# Altium footprint library 常用元件封装库.PcbLib: 1310 footprints (part 48 of 83)
Each footprint in its own frame and in the unit in brackets; x right, y up, seen from the top. Pads: shape width x height; smd on the part's side, far side on the other; paste and mask are expansions set on the pad; w line width, h text height; cw(c..) or ccw(c..) is an arc to the next point about the centre after c.
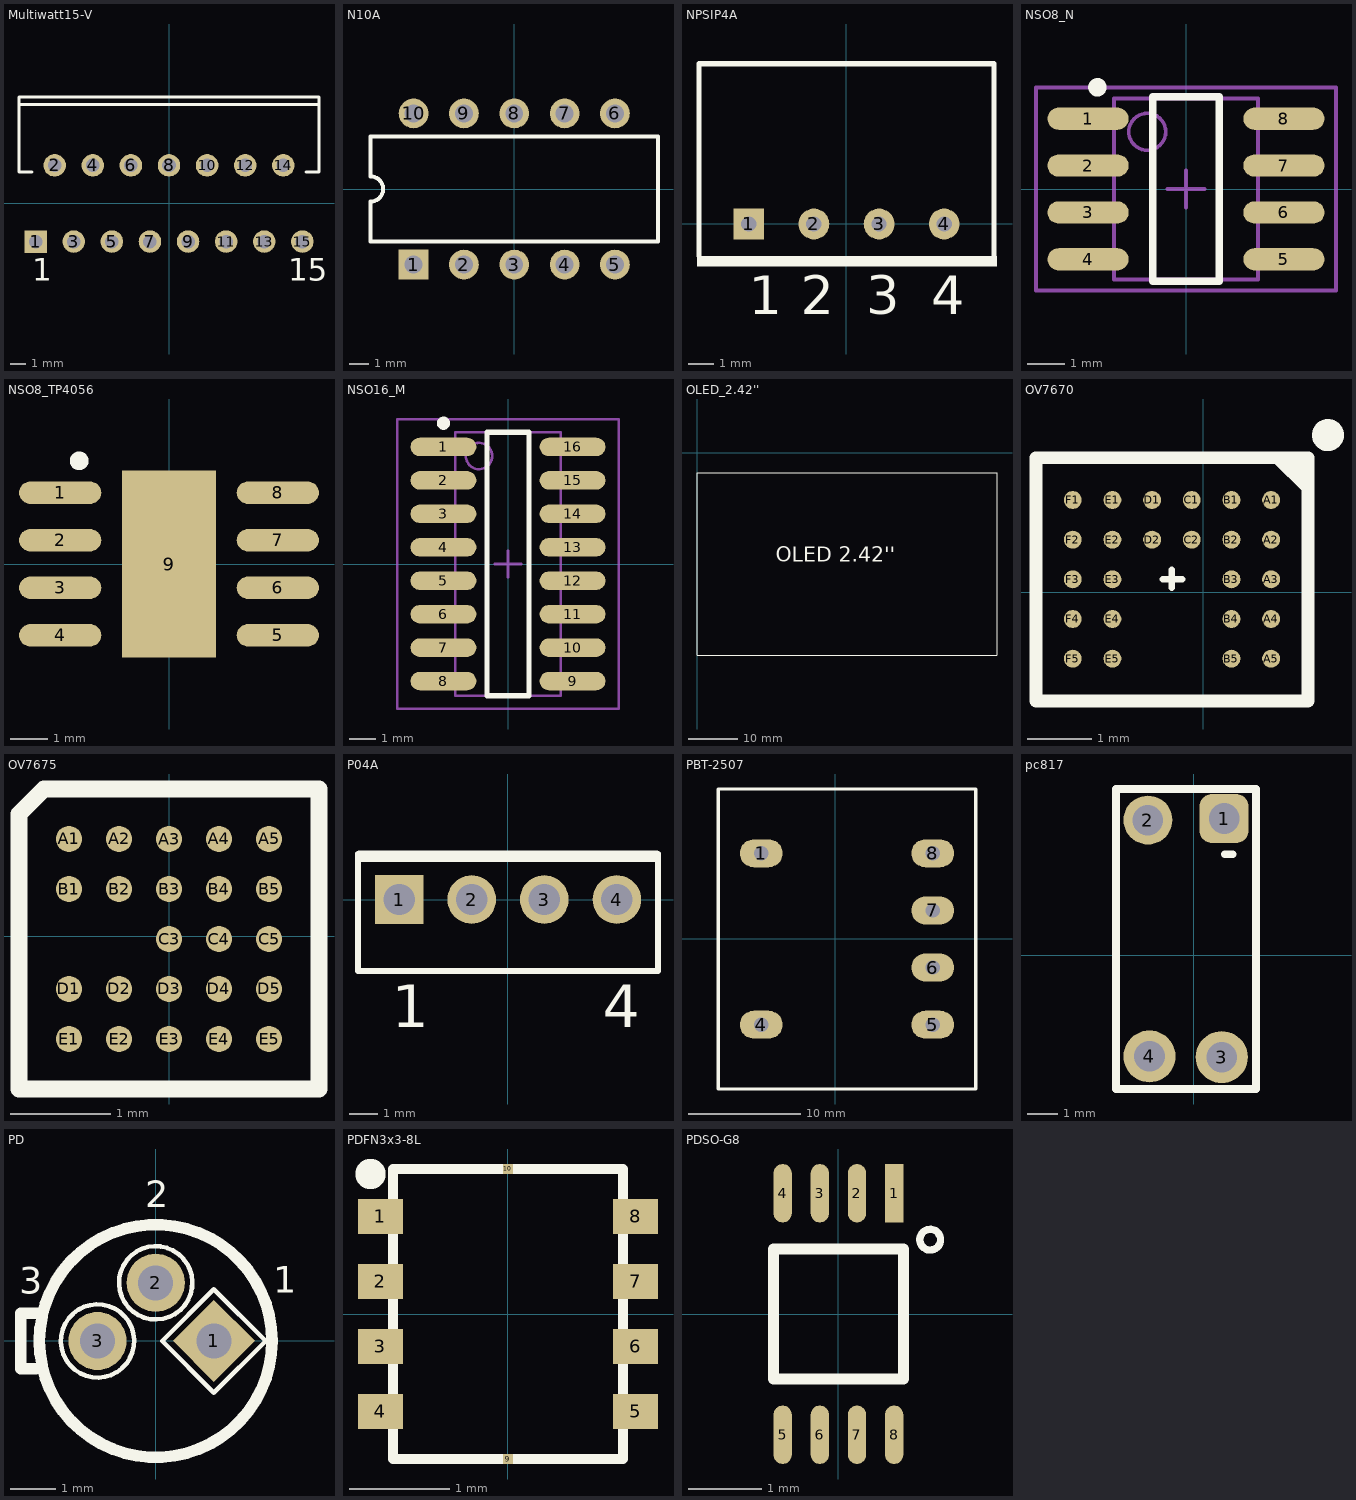
[diagram p47: the footprints below, top view; thin cyan lines are the x and y axes]

## Multiwatt15-V [mm]
height 21
pads (15):
  rect 1.5x1.5 hole 0.9: 1(-8.89,-2.54)
  round 1.5 hole 0.9: 2(-7.62,2.54) 3(-6.35,-2.54) 4(-5.08,2.54) 5(-3.81,-2.54) 6(-2.54,2.54) 7(-1.27,-2.54) 8(0,2.54) 9(1.27,-2.54) 10(2.54,2.54) 11(3.81,-2.54) 12(5.08,2.54) 13(6.35,-2.54) 14(7.62,2.54) 15(8.89,-2.54)
Top Overlay:
  lines w0.2: -10,6.59 10,6.59 ; -9.144,2.09 -10,2.09 -10,7.09 10,7.09 10,2.09 9.144,2.09
  text "1" at -9.12,-5.165 h1.5
  text "15" at 7.94,-5.165 h1.5

## N10A [mm] "DIP; 10 Leads; Row Spacing 7.62 mm; Pitch 2.54 mm"
height 5.08
pads (10):
  rect 1.5x1.5 hole 0.9: 1(-5.08,-3.81)
  round 1.5 hole 0.9: 2(-2.54,-3.81) 3(0,-3.81) 4(2.54,-3.81) 5(5.08,-3.81) 6(5.08,3.81) 7(2.54,3.81) 8(0,3.81) 9(-2.54,3.81) 10(-5.08,3.81)
Top Overlay:
  lines w0.2: -7.25,-2.65 7.25,-2.65 7.25,2.65 -7.25,2.65 -7.25,0.635 cw(c-7.25,0) -7.25,-0.635 -7.25,-2.65

## NPSIP4A [mm] "SIP; 4 Leads; Body 10 x 11.5 x 7.5 mm (typ); Pitch 2.54 mm"
height 10.6
pads (4):
  rect 1.2x1.2 hole 0.6: 1(-3.81,0)
  round 1.2 hole 0.6: 2(-1.27,0) 3(1.27,0) 4(3.81,0)
Top Overlay:
  rectangle: -5.83,-1.65 5.87,-1.25
  lines w0.2: -5.75,-1.25 -5.75,6.25 5.75,6.25 5.75,-1.25
  text "4" at 3.302,-3.52 h1.5
  text "3" at 0.762,-3.52 h1.5
  text "2" at -1.778,-3.52 h1.5
  text "1" at -3.81,-3.52 h1.5

## NSO8_N [mm] "SOIC-max660"
height 1.75
pads (8):
  oval 2.2x0.6 smd: 1(-2.654,1.905) 2(-2.654,0.635) 3(-2.654,-0.635) 4(-2.654,-1.905) 5(2.654,-1.905) 6(2.654,-0.635) 7(2.654,0.635) 8(2.654,1.905)
Top Overlay:
  circle w0.25: c-2.4,2.755 r0.125
  lines w0.2: -0.9,-2.5 -0.9,2.5 0.9,2.5 0.9,-2.5 -0.9,-2.5
Mechanical 13:
  circle w0.1: c-1.05,1.55 r0.5
  lines w0.1: -1.95,-2.45 -1.95,2.45 1.95,2.45 1.95,-2.45 -1.95,-2.45
Mechanical 15:
  lines w0.1: -0.5,0 0.5,0 ; 0,-0.5 0,0.5 ; -4.064,-2.75 -4.064,2.75 4.064,2.75 4.064,-2.75 -4.064,-2.75
3D body: height 1.75, standoff 0, extent -1.95,-2.45 1.95,2.45

## NSO8_TP4056 [mm] "SOIC-max660"
height 1.75
pads (9):
  oval 2.2x0.6 smd: 1(-2.908,1.905) 2(-2.908,0.635) 3(-2.908,-0.635) 4(-2.908,-1.905) 5(2.908,-1.905) 6(2.908,-0.635) 7(2.908,0.635) 8(2.908,1.905)
  rect 2.5x5 smd: 9(0,0)
Top Overlay:
  circle w0.25: c-2.4,2.755 r0.125

## NSO16_M [mm] "SOIC, 16-Leads, Body 9.9x3.9mm, Pitch 1.27mm, IPC Low Density"
height 1.75
pads (16):
  oval 2.5x0.7 smd: 1(-2.45,4.445) 2(-2.45,3.175) 3(-2.45,1.905) 4(-2.45,0.635) 5(-2.45,-0.635) 6(-2.45,-1.905) 7(-2.45,-3.175) 8(-2.45,-4.445) 9(2.45,-4.445) 10(2.45,-3.175) 11(2.45,-1.905) 12(2.45,-0.635) 13(2.45,0.635) 14(2.45,1.905) 15(2.45,3.175) 16(2.45,4.445)
Top Overlay:
  circle w0.25: c-2.45,5.345 r0.125
  lines w0.2: -0.8,-5 0.8,-5 0.8,5 -0.8,5 -0.8,-5
Mechanical 13:
  circle w0.1: c-1.1,4.1 r0.5
  lines w0.1: -2,-5 2,-5 2,5 -2,5 -2,-5
Mechanical 15:
  lines w0.1: -0.5,0 0.5,0 ; 0,-0.5 0,0.5 ; -4.2,-5.5 4.2,-5.5 4.2,5.5 -4.2,5.5 -4.2,-5.5
3D body: height 1.75, standoff 0, extent -2,-5 2,5

## OLED_2.42'' [mil]
Top Overlay:
  lines w6: 0,-1620 2400,-1620 2401.57,-1618.43 2401.57,-160 0,-160 0,-1620
  text "OLED 2.42''" at 630,-870 h120
3D body "User Library-DD-12864YW-6K.STEP": height 92.56, standoff 5.94, extent 9.05,-1618.35 2390.94,-4.17

## OV7670 [mm]
pads (24):
  round 0.28 smd: A1(1.062,1.44) A2(1.062,0.82) A3(1.062,0.2) A4(1.062,-0.42) A5(1.062,-1.04) B1(0.442,1.44) B2(0.442,0.82) B3(0.442,0.2) B4(0.442,-0.42) B5(0.442,-1.04) C1(-0.178,1.44) C2(-0.178,0.82) D1(-0.798,1.44) D2(-0.798,0.82) E1(-1.418,1.44) E2(-1.418,0.82) E3(-1.418,0.2) E4(-1.418,-0.42) E5(-1.418,-1.04) F1(-2.038,1.44) F2(-2.038,0.82) F3(-2.038,0.2) F4(-2.038,-0.42) F5(-2.038,-1.04)
Top Overlay:
  circle w0.25: c1.951,2.454 r0.125
  region: 1.637,1.628 1.165,2.1 1.637,2.1
  lines w0.102: -0.632,0.2 -0.327,0.2 ; -0.488,0.068 -0.488,0.347
  lines w0.2: 1.165,2.1 1.637,1.628 ; -2.613,-1.7 1.637,-1.7 1.637,2.1 -2.613,2.1 -2.613,-1.7

## OV7675 [mm]
height 1.45
pads (23):
  round 0.26 smd: A1(-1,0.973) A2(-0.5,0.973) A3(0,0.973) A4(0.5,0.973) A5(1,0.973) B1(-1,0.473) B2(-0.5,0.473) B3(0,0.473) B4(0.5,0.473) B5(1,0.473) C3(0,-0.027) C4(0.5,-0.027) C5(1,-0.027) D1(-1,-0.527) D2(-0.5,-0.527) D3(0,-0.527) D4(0.5,-0.527) D5(1,-0.527) E1(-1,-1.027) E2(-0.5,-1.027) E3(0,-1.027) E4(0.5,-1.027) E5(1,-1.027)
Top Overlay:
  lines w0.17: -1.5,-1.527 -1.5,1.223 -1.25,1.473 1.5,1.473 1.5,-1.527 -1.5,-1.527

## P04A [mm] "TO, Thru-Hole, Vertical, Heatsink Mounted; 4 In-Line Leads; Pitch 2.54 mm"
height 20.6
pads (4):
  rect 1.7x1.7 hole 1.1: 1(-3.81,0)
  round 1.7 hole 1.1: 2(-1.27,0) 3(1.27,0) 4(3.81,0)
Top Overlay:
  rectangle: -5.25,1.311 5.25,1.711
  lines w0.2: -5.25,1.6 -5.25,-2.5 5.25,-2.5 5.25,1.6
  text "4" at 3.31,-4.475 h1.5
  text "1" at -4.06,-4.475 h1.5

## PBT-2507 [mil]
pads (6):
  oval 150x98 hole 50: 1(-259,299) 4(-259,-301) 5(341,-301) 6(341,-101) 7(341,99) 8(341,299)
Top Overlay:
  lines w12: -409,-526 -409,524 491,524 491,-526 -409,-526

## pc817 [mm]
pads (4):
  rrect50% 1.6x1.6 hole 1: 1(0.991,4.47)
  round 1.6 hole 1: 2(-1.499,4.42)
  round 1.7 hole 1: 3(0.914,-3.327) 4(-1.448,-3.302)
Top Overlay:
  lines w0.254: 1.016,3.302 1.27,3.302 ; -2.54,-4.369 -2.54,5.436 2.032,5.436 2.032,-4.369 -2.54,-4.369
3D body "User Library-DIP4-7_62-2_54.STEP": height 4.3, standoff -2.7, extent -2.524,-3.381 2.066,4.499

## PCBComponent_1 [mil]

## PD [mil]
pads (3):
  rect 50x50 hole 30 rot 45: 1(50,0)
  round 50 hole 30: 2(0,50) 3(-50,0)
Top Overlay:
  circle w10: c0,0 r100
  lines w3.94: -18.5,1 ccw(c-50,0) -18.5,0.98 ; 5.5,0 50,-44.5 94.5,0 50,44.5 5.5,0 ; 31.5,51 ccw(c0,50) 31.5,50.98
  lines w9.84: -103,-24 -116,-24 -116,24 -102,24
  text "3" at -117.5,33 h39.37
  text "2" at -9,107 h39.37
  text "1" at 101,33.5 h39.37
Bottom Overlay:
  lines w3.94: -18.5,1 ccw(c-50,0) -18.5,0.98 ; 5.5,0 50,44.5 94.5,0 50,-44.5 5.5,0 ; 31.5,51 ccw(c0,50) 31.5,50.98

## PDFN3x3-8L [mm]
pads (10):
  rect 0.45x0.35 smd: 1(-1.275,0.975) 2(-1.275,0.325) 3(-1.275,-0.325) 4(-1.275,-0.975) 5(1.275,-0.975) 6(1.275,-0.325) 7(1.275,0.325) 8(1.275,0.975)
  rect 0.1x0.1 smd: 9(0,-1.45) 10(0,1.45)
Top Overlay:
  circle w0.254: c-1.375,1.4 r0.025
  lines w0.102: -1.15,-1.45 -1.15,1.45 1.15,1.45 1.15,-1.45 -1.15,-1.45

## PDSO-G8 [mil] "U"
height 157.48
pads (8):
  rect 9.84x31.5 smd: 1(30,65)
  oval 9.84x31.5 smd: 2(10,65) 3(-10,65) 4(-30,65) 5(-30,-65) 6(-10,-65) 7(10,-65) 8(30,-65)
Top Overlay:
  circle w3.94: c49.42,40 r5.58
  lines w5.91: -35,-35 -35,35 35,35 35,-35 -35,-35